# Altium integrated library ICL_passives_v1.IntLib: 295 symbols
Pins are listed as number, name and electrical type; pins without a type are passive.

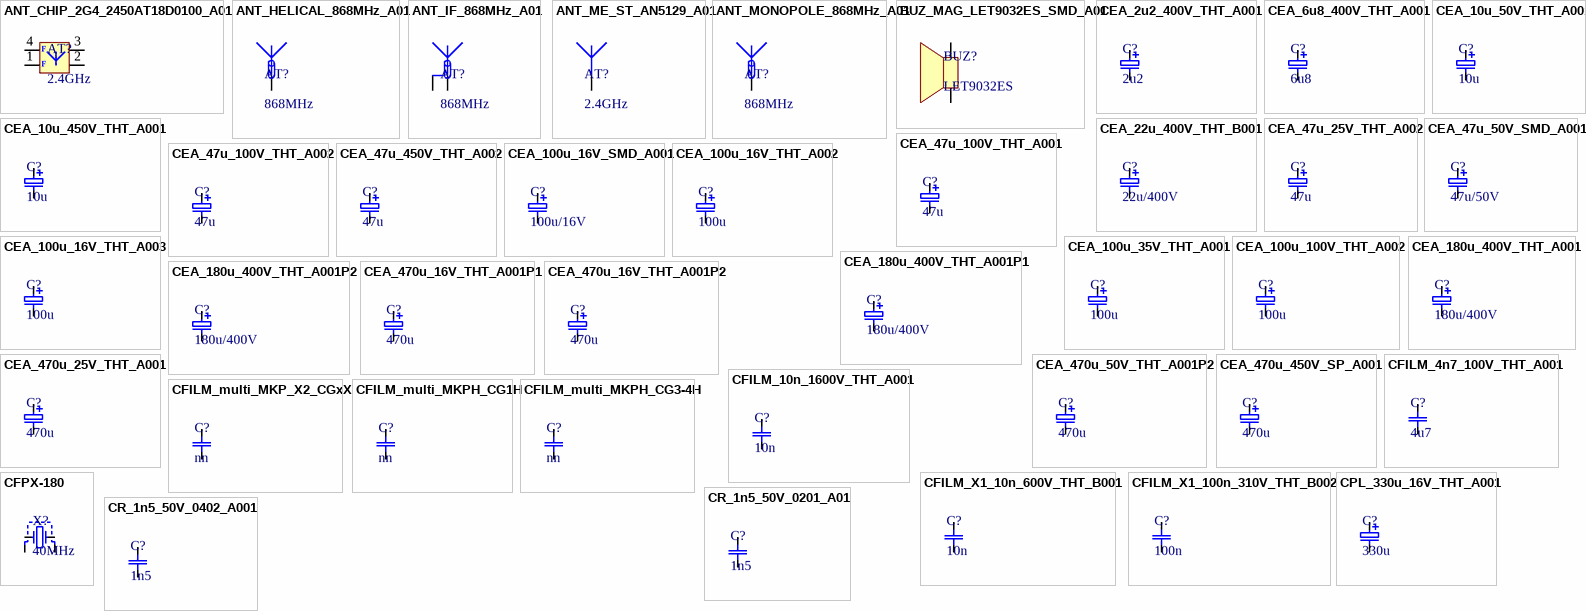
[diagram p0: symbols ANT_CHIP_2G4_2450AT18D0100_A01 to CR_1n5_50V_0402_A001]

## ANT_CHIP_2G4_2450AT18D0100_A01
designator AT?, comment 2.4GHz
50 Ohm 2.4GHz; ICLN: ANT_2G4_SMD_2450AT18D0100_A01
footprint 2450AT18D0100 (2,4GHz BLE/WiFi antena)
pins: 1, 2, 3, 4
text: F

## ANT_HELICAL_868MHz_A01
designator AT?, comment 868MHz
868 MHz: 10-j88; VSWR 22; PCB 0.8mm; ICLN: NA
footprint ANT_868MHz_HELICAL_A01 (868 MHz: 10-j88; VSWR 22; PCB 0.8mm)
pins: 2

## ANT_IF_868MHz_A01
designator AT?, comment 868MHz
50 Ohm 868 MHz: 30+j11; VSWR 1.8; PCB 0.8mm; ICLN: NA
footprint ANT_868MHz_IF_A01 (50 Ohm 868 MHz: 30+j11; VSWR 1.8; PCB 0.8mm)
pins: 1, 2

## ANT_ME_ST_AN5129_A01
designator AT?, comment 2.4GHz  (no BOM)
50 Ohm 2.4GHz ST; ICLN: NA
footprint ANT_ST_AN5129_BLE (2.4GHz ST antena)
pins: 1

## ANT_MONOPOLE_868MHz_A01
designator AT?, comment 868MHz
50 Ohm 868 MHz: 30+j11; VSWR 1.8; PCB 1.6mm; ICLN: NA
footprint ANT_868MHz_MONOPOLE_A01 (50 Ohm 868 MHz: 30+j11; VSWR 1.8; PCB 1.6mm)
pins: 2

## BUZ_MAG_LET9032ES_SMD_A01
designator BUZ?, comment LET9032ES
Buzzer SMD magnetic; ICLN: BUZ_MAG_LET9032ES_SMD_A01
footprint BUZZER_LET9032ES (LET9032ES-03L-2.7-16-R)
pins: 1, 2

## CEA_2u2_400V_THT_A001
designator C?, comment 2u2
2u2/400V Aluminum electrolic R=8mm H=11.5mm e=5mm; ICLN: CEA_2u2_400V_THT_A001
footprint CEA_R8_H11_5 (snap 3.5mm fi 8mm h 11.5mm)
pins: 1, 2

## CEA_6u8_400V_THT_A001
designator C?, comment 6u8
6u8/400V Aluminum electrolic R=10mm H=16mm e=5mm; ICLN: CEA_6u8_400V_THT_A001
footprint CEA_R10H16E5_1 (fi 10mm L 16mm e 5mm)
pins: 1, 2

## CEA_10u_50V_THT_A001
designator C?, comment 10u
cap. aluminium 10u/50V THT e=2.5mm H=11mm Fi=5; ICLN: CEA_10u_50V_THT_A001
footprint CEA_R6_3_H11_5 (tht 2.5mm fi 6,3mm h 11.5mm)
pins: 1, 2

## CEA_10u_450V_THT_A001
designator C?, comment 10u
180u/400V Aluminum electrolic R=12.5mm H=20mm e=5mm; ITSN: CEA_10u_450V_THT_A001
footprint CEA_R12,5_H20_A001 (e=5mm fi 12,5mm h 20mm)
pins: 1, 2

## CEA_22u_400V_THT_B001
designator C?, comment 22u/400V
22u/400V Aluminum electrolic; ICLN: CEA_22uF_400V_12_25_B001
footprint CEA_R12,5_H25_B001 (e=5mm and 7.5mm fi 12,5mm h 25mm)
pins: 1, 2

## CEA_47u_25V_THT_A002
designator C?, comment 47u
cap. aluminium low esr 47u/25V THT e=3,5mm H=11mm; ICLN: CEA_47u_25V_THT_A002
footprint CEA_R6_3_H11_5 (tht 2.5mm fi 6,3mm h 11.5mm)
pins: 1, 2

## CEA_47u_50V_SMD_A001
designator C?, comment 47u/50V
47u/50V Aluminum electrolic R=8mm H=6.5mm; ICLN: CEA_47u_50V_SMD_A001
footprint CEA_S_D8.0_H6.5_A001
pins: 1, 2

## CEA_47u_100V_THT_A001
designator C?, comment 47u
47u/100V Aluminum electrolic R=12.5mm H=20mm e=5mm; ICLN: CEA_47u_100V_THT_A003
footprint CEA_R12,5_H20_A001 (e=5mm fi 12,5mm h 20mm)
pins: 1, 2

## CEA_47u_100V_THT_A002
designator C?, comment 47u
47u/100V  R=10mm H=12mm e=5mm; ICLN: CEA_47u_100V_THT_A002
footprint CEA_R10_H12_A002 (e=5mm fi 10mm h 12mm)
pins: 1, 2

## CEA_47u_450V_THT_A002
designator C?, comment 47u
47u/450V fi19 h 30 e7.5, 10, 12; ITSN: CEA_47u_450V_THT_A002
footprint CEA_R19_H30_e75_10_v1 (e=7.5+10+12mm  fi 19mm h 30mm)
pins: 1, 2

## CEA_100u_16V_SMD_A001
designator C?, comment 100u/16V
100u/16V Aluminum electrolic R=6,3mm H=5.8mm; ICLN: CEA_100u_16V_SMD_A001
footprint CEA_S_D6.3_H5.8_A001
pins: 1, 2

## CEA_100u_16V_THT_A002
designator C?, comment 100u
100u/16V Aluminum electrolic R=6,3mm H=11,5mm e=2,5mm; ICLN: CEA_100u_16V_THT_A002
footprint CEA_R6_3_H11_5 (snap 3.5mm fi 8mm h 11.5mm)
pins: 1, 2

## CEA_100u_16V_THT_A003
designator C?, comment 100u
100u/16V Aluminum electrolic R=6,3mm H=11,5mm e=2,5mm; ICLN: CEA_100u_16V_THT_A003
footprint CEA_R6_3_H11_5 (snap 3.5mm fi 8mm h 11.5mm)
pins: 1, 2

## CEA_100u_35V_THT_A001
designator C?, comment 100u
cap. aluminium 100u/35V Low ESR THT e=2.5mm H=11mm Fi=5; ICLN: CEA_100u_35V_THT_A002
footprint CEA_R6_3_H11_5 (tht 2.5mm fi 6,3mm h 11.5mm)
pins: 1, 2

## CEA_100u_100V_THT_A002
designator C?, comment 100u
100u/100V Aluminum electrolic R=12.5mm H=25mm e=5mm; ICLN: CEA_100u_100V_THT_A002
footprint CEA_R12,5_H25_A001 (e=5mm fi 12,5mm h 25mm)
pins: 1, 2

## CEA_180u_400V_THT_A001
designator C?, comment 180u/400V
180u/400V Aluminum electrolic R=18mm H=45mm e=7.5mm; ITSN: CEA_180u_400V_THT_A001
footprint CEA_R18H45E7.5_1
pins: 1, 2

## CEA_180u_400V_THT_A001P1
designator C?, comment 180u/400V
180u/400V Aluminum electrolic R=18mm H=45mm e=7.5mm; poziomy prawy; ITSN: CEA_180u_400V_THT_A001P1
footprint CEA_R18H45E7.5_VR_1 (vertival right)
pins: 1, 2

## CEA_180u_400V_THT_A001P2
designator C?, comment 180u/400V
180u/400V Aluminum electrolic R=18mm H=45mm e=7.5mm; poziomy lewy; ITSN: CEA_180u_400V_THT_A001P2
footprint CEA_R18H45E7.5_VL_1 (vertival left)
pins: 1, 2

## CEA_470u_16V_THT_A001P1
designator C?, comment 470u
cap. aluminium 470u/16V THT e=3,5mm H=11mm; ITSN: CEA_470u_16V_THT_A001P1
footprint CEA_R8_H11_5_VL_1 (snap 3.5mm fi 8mm h 11.5mm)
pins: 1, 2

## CEA_470u_16V_THT_A001P2
designator C?, comment 470u
cap. aluminium 470u/16V THT e=3,5mm H=11mm; ITSN: CEA_470u_16V_THT_A001P2
footprint CEA_R8_H11_5_VR_1 (snap 3.5mm fi 8mm h 11.5mm)
pins: 1, 2

## CEA_470u_25V_THT_A001
designator C?, comment 470u
470u/25V Aluminum electrolic R=12.5mm H=20mm e=5mm; ICLN: CEA_470u_25V_THT_A001
footprint CEA_R12,5_H20_A001 (e=5mm fi 12,5mm h 20mm)
pins: 1, 2

## CEA_470u_50V_THT_A001P2
designator C?, comment 470u
cap. aluminium 470u/50V THT e=5mm R=12.5mm H=25mm; ITSN: CEA_470u_50V_THT_A001P1
footprint CEA_R12,5_H25_VL_A001P1 (e=5mm fi 12,5mm h 25mm)
pins: 1, 2

## CEA_470u_450V_SP_A001
designator C?, comment 470u
cap. aluminium 470u/450V THT e=10mm H=50mm; ITSN: CEA_470u_450V_SP_A001
footprint CEA_D35mm_H50mm_SP_A001
pins: 1, 2

## CFILM_4n7_100V_THT_A001
designator C?, comment 4u7
4u7/100V MKT Film capacitor; ITSN: CFILM_4n7_100V_THT_A001
footprint MPEM-4U7R20 (4u7/100V e = 20mm)
pins: 1, 2

## CFILM_10n_1600V_THT_A001
designator C?, comment 10n
10n/1600V MKT Kemet R76 Film capacitor; ITSN: CMKT_10n_1600V_THT_R76_A001
footprint R76-MPK_e15mm_l18mm_t5mm
pins: 1, 2

## CFILM_multi_MKP_X2_CGxX
designator C?, comment nn
CG-ELEC bulk DC link capacitor; ICLN: CMKP_xx_MKP_X2_CGxX_N001
footprint MKP-X2_CGxX_series (Universal footprint for CG-ELEC resonant cap)
pins: 1, 2

## CFILM_multi_MKPH_CG1H
designator C?, comment nn
CG-ELEC snubber capacitor; ICLN: CMKP_xx_MKPH_CG1H_N001
footprint MKPH_CG1H_series (Universal footprint for CG-ELEC snubber cap.)
pins: 1, 2

## CFILM_multi_MKPH_CG3-4H
designator C?, comment nn
CG-ELEC resonant capacitor; ICLN: CMKP_xx_MKPH_CG3-4H_N001
footprint MKPH_CGxH_series (Universal footprint for CG-ELEC resonant cap)
pins: 1, 2

## CFILM_X1_10n_600V_THT_B001
designator C?, comment 10n
10n/600V X1; ICLN: CFILM_X1_10n_600V_THT_B001
footprint C_X1_KEMET_B001
pins: 1, 2

## CFILM_X1_100n_310V_THT_B002
designator C?, comment 100n
100n/310VAC X1 18mm x 7mm; e=10 - 15 mm; ICLN: CFILM_100n_310V_THT_B002
footprint C_X1_18x8_B002
pins: 1, 2

## CFPX-180
designator X?, comment 40MHz
footprint CFPX-180 (kwarc)
pins: 1, 2, 3, 4

## CPL_330u_16V_THT_A001
designator C?, comment 330u
330u/16V polimer R=8mm H=8mm e=3.5mm; ICLN: CPL_330u_16V_THT_A001
footprint CPOL_R8_H8_THT_A001 (polimer l=8.0mm fi= 8mm e=3.5)
pins: 1, 2

## CR_1n5_50V_0201_A01
designator C?, comment 1n5
1n5F/ 50V X7R 0201; ICLN: CR_1n5_50V_X7R_0201_A01
footprint 0201C
pins: 1, 2

## CR_1n5_50V_0402_A001
designator C?, comment 1n5
1n5F/ 50V X7R 0402; ICLN: CR_1n5_50V_X7R_0402_A001
footprint 0402C
pins: 1, 2

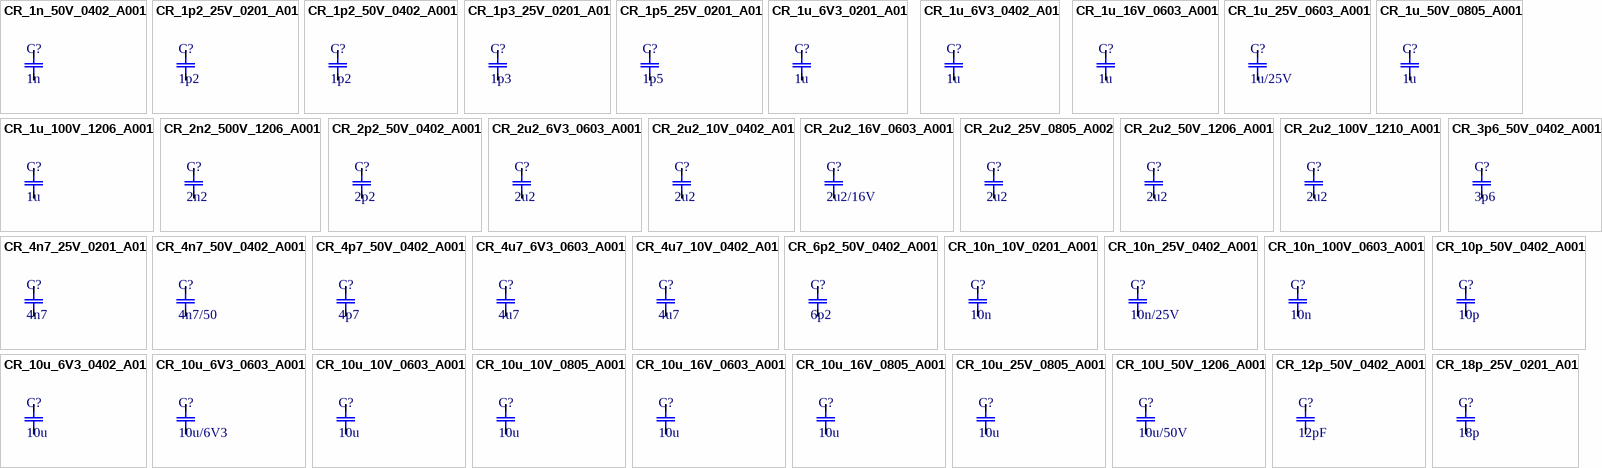
[diagram p1: symbols CR_1n_50V_0402_A001 to CR_18p_25V_0201_A01]

## CR_1n_50V_0402_A001
designator C?, comment 1n
1nF/ 50V X7R 0402; ICLN: CR_1n_50V_X7R_0402_A001
footprint 0402C
pins: 1, 2

## CR_1p2_25V_0201_A01
designator C?, comment 1p2
1p2F/ 25V C0G 0201; ICLN: CR_1p2_25V_C0G_0201_A01
footprint 0201C
pins: 1, 2

## CR_1p2_50V_0402_A001
designator C?, comment 1p2
1p2F/ 50V C0G 0402; ICLN: CR_1p2_50V_C0G_0402_A001
footprint 0402C
pins: 1, 2

## CR_1p3_25V_0201_A01
designator C?, comment 1p3
1p3F/ 25V C0G 0201; ICLN: CR_1p3_25V_C0G_0201_A01
footprint 0201C
pins: 1, 2

## CR_1p5_25V_0201_A01
designator C?, comment 1p5
1p5F/ 25V C0G 0201; ICLN: CR_1p5_25V_C0G_0201_A01
footprint 0201C
pins: 1, 2

## CR_1u_6V3_0201_A01
designator C?, comment 1u
1uF/6V3 X5R 0201; ICLN: CR_1u_6V3_X5R_0201_A01
footprint 0201C
pins: 1, 2

## CR_1u_6V3_0402_A01
designator C?, comment 1u
1uF/6V3 X7R 0402; ICLN: CR_1u_6V3_X7R_0402_A01
footprint 0402C
pins: 1, 2

## CR_1u_16V_0603_A001
designator C?, comment 1u
1uF/16V X7R 0603; ICLN: CR_1u_16V_X7R_0603_A001
footprint 0603C
pins: 1, 2

## CR_1u_25V_0603_A001
designator C?, comment 1u/25V
1uF/25V X7R 0603; ITSN: CR_1u_25V_X5R_0603_A001
footprint 0603C
pins: 1, 2

## CR_1u_50V_0805_A001
designator C?, comment 1u
1uF/50V X7R 0805; ICLN: CR_1u_50V_X7R_0805_A001
footprint 0805C
pins: 1, 2

## CR_1u_100V_1206_A001
designator C?, comment 1u
1uF/100V X7R 1206; ICLN: CR_1u_100V_X7R_1206_A001
footprint 1206C
pins: 1, 2

## CR_2n2_500V_1206_A001
designator C?, comment 2n2
2n2F/500V X7R 1206; ICLN: CR_2n2_500V_1206_A001
footprint 1206C
pins: 1, 2

## CR_2p2_50V_0402_A001
designator C?, comment 2p2
2p2/50V C0G 0402; ICLN: CR_2p2_50V_C0G_0402_A001
footprint 0402C
pins: 1, 2

## CR_2u2_6V3_0603_A001
designator C?, comment 2u2
2u2/6V3 X5R 0603; ICLN: CR_2u2_6V3_X5R_0603_A001
footprint 0603C
pins: 1, 2

## CR_2u2_10V_0402_A01
designator C?, comment 2u2
2u2/10V X5R 0402; ICLN: CR_2u2_10V_X5R_0402_A01
footprint 0402C
pins: 1, 2

## CR_2u2_16V_0603_A001
designator C?, comment 2u2/16V
2u2/16V X5R 0603; ITSN: CR_2u2_16V_X5R_0603_A001
footprint 0603C
pins: 1, 2

## CR_2u2_25V_0805_A002
designator C?, comment 2u2
2u2/25V X7R 0805; ICLN: CR_2u2_25V_X7R_0805_A001
footprint 0805C
pins: 1, 2

## CR_2u2_50V_1206_A001
designator C?, comment 2u2
2u2/50V X7R 1206; ICLN: CR_2u2_50V_X7R_1206_A001
footprint 1206C
pins: 1, 2

## CR_2u2_100V_1210_A001
designator C?, comment 2u2
2u2F/100V X7R 1210; ICLN: CR_2u2_100V_1210_A001
footprint 1210C
pins: 1, 2

## CR_3p6_50V_0402_A001
designator C?, comment 3p6
3p6/50V C0G 0402; ICLN: CR_3p6_50V_C0G_0402_A001
footprint 0402C
pins: 1, 2

## CR_4n7_25V_0201_A01
designator C?, comment 4n7
4n7 25V X7R 0201; ITSN: CR_4n7_25V_X7R_0201_A01
footprint 0201C
pins: 1, 2

## CR_4n7_50V_0402_A001
designator C?, comment 4n7/50
4n7 25V X7R 0402; ITSN: CR_4n7_50V_X7R_0402_A001
footprint 0402C
pins: 1, 2

## CR_4p7_50V_0402_A001
designator C?, comment 4p7
4p7F/ 50V X7R 0402; ICLN: CR_4p7_50V_X7R_0402_A001
footprint 0402C
pins: 1, 2

## CR_4u7_6V3_0603_A001
designator C?, comment 4u7
4u7/6V3 X5R 0603; ICLN: CR_4u7_6V3_X5R_0603_A001
footprint 0603C
pins: 1, 2

## CR_4u7_10V_0402_A01
designator C?, comment 4u7
4u7/10V X5R 0402; ICLN: CR_4u7_10V_X5R_0402_A01
footprint 0402C
pins: 1, 2

## CR_6p2_50V_0402_A001
designator C?, comment 6p2
6p2/50V C0G 0402; ICLN: CR_6p2_50V_C0G_0402_A001
footprint 0402C
pins: 1, 2

## CR_10n_10V_0201_A001
designator C?, comment 10n
10nF/10V X7R 0201; ICLN: CR_10n_10V_X7R_0201_A001
footprint 0201C
pins: 1, 2

## CR_10n_25V_0402_A001
designator C?, comment 10n/25V
10nF/25V X7R 0402; ICLN: CR_10n_25V_X7R_0402_A001
footprint 0402C
pins: 1, 2

## CR_10n_100V_0603_A001
designator C?, comment 10n
10nF/100V X7R 0603; ITSN: CR_10n_100V_X7R_0603_A001
footprint 0603C
pins: 1, 2

## CR_10p_50V_0402_A001
designator C?, comment 10p
10pF/ 50V C0G 0402; ICLN: CR_10p_50V_0402_C0G_A001
footprint 0402C
pins: 1, 2

## CR_10u_6V3_0402_A01
designator C?, comment 10u
10uF/6V3 X7R 0402; ICLN: CR_10u_6V3_X5R_0402_A01
footprint 0402C
pins: 1, 2

## CR_10u_6V3_0603_A001
designator C?, comment 10u/6V3
10uF/6V3 X7R 0603; ITSN: CR_10u_6V3_X7R_0603_A001
footprint 0603C
pins: 1, 2

## CR_10u_10V_0603_A001
designator C?, comment 10u
10uF/10V X5R 0603; ICLN: CR_10u_10V_0603_A001
footprint 0603C
pins: 1, 2

## CR_10u_10V_0805_A001
designator C?, comment 10u
10uF/10V X5R 0805; ICLN: CR_10u_10V_0805_A001
footprint 0805C
pins: 1, 2

## CR_10u_16V_0603_A001
designator C?, comment 10u
10uF/16V X5R 0603; ITSN: CR_10u_16V_X5R_0603_A001
footprint 0603C
pins: 1, 2

## CR_10u_16V_0805_A001
designator C?, comment 10u
10uF/16V X5R 0805; ICLN: CR_10u_16V_0805_A001
footprint 0805C
pins: 1, 2

## CR_10u_25V_0805_A001
designator C?, comment 10u
10uF/25V X5R 0805; ICLN: CR_10u_25V_X5R_0805_A001
footprint 0805C
pins: 1, 2

## CR_10U_50V_1206_A001
designator C?, comment 10u/50V
10uF/50V X5R 1206; ITSN: CR_10u_50V_X5R_1206_A001
footprint 1206C
pins: 1, 2

## CR_12p_50V_0402_A001
designator C?, comment 12pF
12pF/50V C0G 0402; ICLN: CR_12p_50V_C0G_0402_A001
footprint 0402C
pins: 1, 2

## CR_18p_25V_0201_A01
designator C?, comment 18p
18pF/ 25V C0G 0201; ICLN: CR_18p_25V_C0G_0201_A01
footprint 0201C
pins: 1, 2

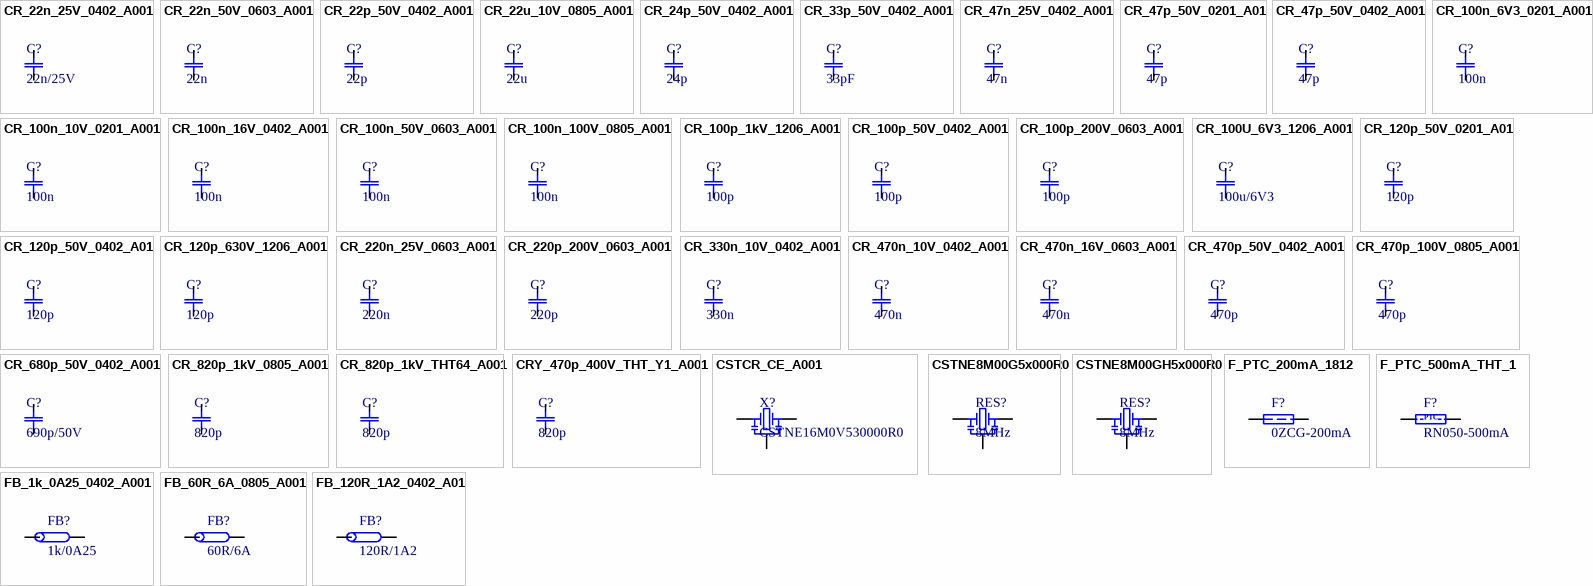
[diagram p2: symbols CR_22n_25V_0402_A001 to FB_120R_1A2_0402_A01]

## CR_22n_25V_0402_A001
designator C?, comment 22n/25V
22n/25V X7R 0402; ITSN: CR_22n_25V_X7R_0402_A001
footprint 0402C
pins: 1, 2

## CR_22n_50V_0603_A001
designator C?, comment 22n
22n/50V X7R 0603; ICLN: CR_22n_50V_X7R_0603_A001
footprint 0603C
pins: 1, 2

## CR_22p_50V_0402_A001
designator C?, comment 22p
22p/50V C0G 0402; ICLN: CR_22p_50V_C0G_0402_A001
footprint 0402C
pins: 1, 2

## CR_22u_10V_0805_A001
designator C?, comment 22u
22uF/10V X5R 0805; ITSN: CR_22u_10V_X5R_0805_A001
footprint 0805C
pins: 1, 2

## CR_24p_50V_0402_A001
designator C?, comment 24p
24p/50V C0G 0402; ICLN: CR_24p_50V_C0G_0402_A001
footprint 0402C
pins: 1, 2

## CR_33p_50V_0402_A001
designator C?, comment 33pF
33pF/50V C0G 0402; ITSN: CR_33p_50V_C0G_0402_A001
footprint 0402C
pins: 1, 2

## CR_47n_25V_0402_A001
designator C?, comment 47n
47nF/ 25V X7R 0402; ICLN: CR_47n_25V_0402_A001
footprint 0402C
pins: 1, 2

## CR_47p_50V_0201_A01
designator C?, comment 47p
47pF/ 50V C0G 0201; ICLN: CR_47p_50V_C0G_0201_A01
footprint 0201C
pins: 1, 2

## CR_47p_50V_0402_A001
designator C?, comment 47p
47pF/ 50V C0G 0402; ICLN: CR_47p_50V_C0G_0402_A001
footprint 0402C
pins: 1, 2

## CR_100n_6V3_0201_A001
designator C?, comment 100n
100nF/6V3 X5R 0201; ICLN: CR_100n_6V3_X5R_0201_A001
footprint 0201C
pins: 1, 2

## CR_100n_10V_0201_A001
designator C?, comment 100n
100nF/10V X5R 0201; ICLN: CR_100n_10V_X5R_0201_A001
footprint 0201C
pins: 1, 2

## CR_100n_16V_0402_A001
designator C?, comment 100n
100nF/16V X7R 0402; ICLN: CR_100n_16V_X7R_0402_A001
footprint 0402C
pins: 1, 2

## CR_100n_50V_0603_A001
designator C?, comment 100n
100nF/50V X7R 0603; ICLN: CR_100n_50V_X7R_0603_A001
footprint 0603C
pins: 1, 2

## CR_100n_100V_0805_A001
designator C?, comment 100n
100nF/100V X7R 0805; ICLN: CR_100n_100V_X7R_0805_A001
footprint 0805C
pins: 1, 2

## CR_100p_1kV_1206_A001
designator C?, comment 100p
100pF/1kV C0G 1206; ICLN: CR_100p_1kV_1206_C0G_A001
footprint 1206C
pins: 1, 2

## CR_100p_50V_0402_A001
designator C?, comment 100p
100pF/ 50V C0G 0402; ICLN: CR_100p_50V_C0G_0402_A001
footprint 0402C
pins: 1, 2

## CR_100p_200V_0603_A001
designator C?, comment 100p
100p/200V X7R 0603; ICLN: CR_100p_200V_X7R_0603_A001
footprint 0603C
pins: 1, 2

## CR_100U_6V3_1206_A001
designator C?, comment 100u/6V3
100uF/6V3 X5R 1206; ITSN: CR_100u_6V3_X5R_1206_A001
footprint 1206C
pins: 1, 2

## CR_120p_50V_0201_A01
designator C?, comment 120p
120pF/50V C0G 0201; ICLN: CR_120p_50V_C0G_0201_A01
footprint 0201C
pins: 1, 2

## CR_120p_50V_0402_A01
designator C?, comment 120p
120pF/50V C0G 0402; ICLN: CR_120p_50V_C0G_0402_A01
footprint 0402C
pins: 1, 2

## CR_120p_630V_1206_A001
designator C?, comment 120p
120pF/630V C0G 1206; ICLN: CR_120p_630V_1206_C0G_A001
footprint 1206C
pins: 1, 2

## CR_220n_25V_0603_A001
designator C?, comment 220n
220n/25V X7R 0603; ICLN: CR_220n_25V_X7R_0603_A001
footprint 0603C
pins: 1, 2

## CR_220p_200V_0603_A001
designator C?, comment 220p
220p/200V X7R 0603; ITSN: CR_220p_200V_X7R_0603_A001
footprint 0603C
pins: 1, 2

## CR_330n_10V_0402_A001
designator C?, comment 330n
330nF/10V X5R 0402; ICLN: CR_330n_10V_0402_A001
footprint 0402C
pins: 1, 2

## CR_470n_10V_0402_A001
designator C?, comment 470n
470n/10V X5R 0402; ICLN: CR_470n_10V_0402_X5R_A001
footprint 0402C
pins: 1, 2

## CR_470n_16V_0603_A001
designator C?, comment 470n
470n/16V X7R 0603; ICLN: CR_470n_16V_0603_X7R_A001
footprint 0603C
pins: 1, 2

## CR_470p_50V_0402_A001
designator C?, comment 470p
470p/50V C0G 0402; ICLN: CR_470p_50V_C0G_0402_A001
footprint 0402C
pins: 1, 2

## CR_470p_100V_0805_A001
designator C?, comment 470p
470p/100V C0G 0805; ICLN: CR_470p_100V_C0G_0805_A001
footprint 0805C
pins: 1, 2

## CR_680p_50V_0402_A001
designator C?, comment 690p/50V
680pF/ 50V C0G 0402; ITSN: CR_680p_50V_C0G_0402_A001
footprint 0402C
pins: 1, 2

## CR_820p_1kV_0805_A001
designator C?, comment 820p
820p/1kV X7R 0805; ICLN: CR_820p_1kV_X7R_0805_A001
footprint 0805C
pins: 1, 2

## CR_820p_1kV_THT64_A001
designator C?, comment 820p
820p / 1kV; ICLN: CR_820p_1kV_THT_64MM_A001
footprint CRY_THT_e10_75_D9_T5_A001 (cr e=7.5-10 D=7.5 T=4 THT)
pins: 1, 2

## CRY_470p_400V_THT_Y1_A001
designator C?, comment 820p
470p/400V Y1 e=7.5 - 10 mm H= 10; ICLN: CRY_470p_400V_Y1_THT_A001
footprint CRY_THT_e10_75_D9_T5_A001 (cr e=7.5-10 D=7.5 T=4 THT)
pins: 1, 2

## CSTCR_CE_A001
designator X?, comment CSTNE16M0V530000R0
CSTNE16M0V530000R0 16MHz; ITSN: XTAL_CSTCE_16MHz_SMD_A001
footprint CSTCE_NE_A001 (Murata ceramic resonator e=1,2mm)
pins: 1, 2, 3

## CSTNE8M00G5x000R0
designator RES?, comment 8MHz
ceramic resonator  8MHz 0,5%CSTNE8M00G55C000R0; ICLN: RES_8MHz_SMD_0,5%_A001
footprint CSTNE_NE_A001 (Murata ceramic resonator e=1,2mm)
pins: 1, 2, 3

## CSTNE8M00GH5x000R0
designator RES?, comment 8MHz
ceramic resonator  8MHz 0,07%CSTNE8M00GH5C000R0; ICLN: RES_8MHz_SMD_0,07%_A001
footprint CSTNE_NE_A001 (Murata ceramic resonator e=1,2mm)
pins: 1, 2, 3

## F_PTC_200mA_1812
designator F?, comment 0ZCG-200mA
Polimer PTC fuse 200mA/60V 1812; ICLN: F_POLI_200mA_SMD_1812_A001
footprint 1812F
pins: 1, 2

## F_PTC_500mA_THT_1
designator F?, comment RN050-500mA
Polimer PTC fuse 500mA/90V THT; ICLN: F_POLI_500mA_THT_d10e5_A001
footprint RN0xx_A001 (fi 10mm L 14mm e 5.1mm)
pins: 1, 2
text: PTC

## FB_1k_0A25_0402_A001
designator FB?, comment 1k/0A25
1k @ 100MHz 0A25 0402; ICLN: FB_1k_0A25_0402_A001
footprint 0402R
pins: 1, 2

## FB_60R_6A_0805_A001
designator FB?, comment 60R/6A
60R @ 100MHz 0805; ICLN: FB_60R_5A_0805_A001
footprint 0805R
pins: 1, 2

## FB_120R_1A2_0402_A01
designator FB?, comment 120R/1A2
120R @ 100MHz 1A2 0402; ICLN: FB_120R_1A2_0402_A01
footprint 0402R
pins: 1, 2

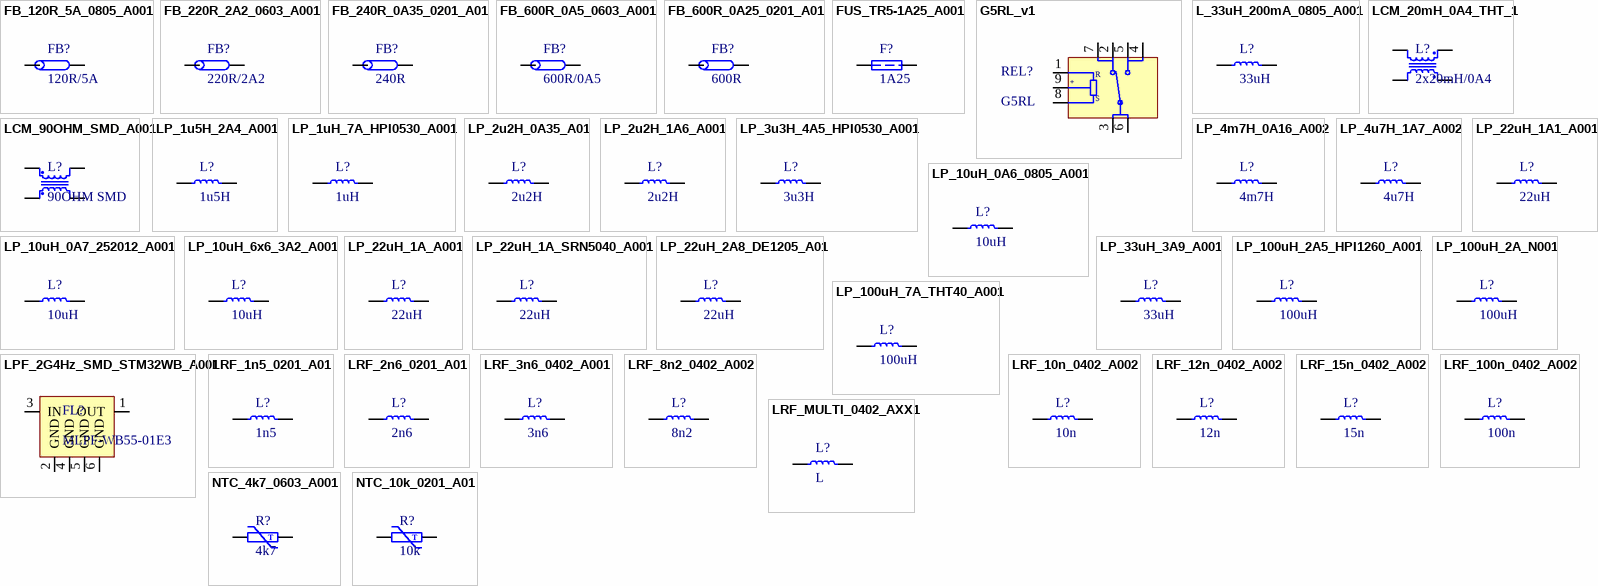
[diagram p3: symbols FB_120R_5A_0805_A001 to NTC_10k_0201_A01]

## FB_120R_5A_0805_A001
designator FB?, comment 120R/5A
120R @ 100MHz 0805; ICLN: FB_120R_5A_0805_A001
footprint 0805R
pins: 1, 2

## FB_220R_2A2_0603_A001
designator FB?, comment 220R/2A2
220R @ 100MHz 0603; ITSN: FB_220R_2A2_0603_A001
footprint 0603R
pins: 1, 2

## FB_240R_0A35_0201_A01
designator FB?, comment 240R
240R @ 100MHz 0A35 0201; ICLN: FB_240R_0A35_0201_A01
footprint 0201R
pins: 1, 2

## FB_600R_0A5_0603_A001
designator FB?, comment 600R/0A5
600R @ 100MHz 0603; ICLN: FB_600R_0A5_0603_A001
footprint 0603R
pins: 1, 2

## FB_600R_0A25_0201_A01
designator FB?, comment 600R
600R @ 100MHz 0A25 0201; ICLN: FB_600R_0A25_0201_A01
footprint 0201R
pins: 1, 2

## FUS_TR5-1A25_A001
designator F?, comment 1A25
TR5 1,25A fuse; ICLN: FUSE_1A25_TR5_THT_A001
footprint FUSE_MRT_THT_v1 (MRT round fuse THT soldering)
pins: 1, 2
